# Altium footprint library xialeste-20221201.PcbLib: 195 footprints (part 7 of 13)
Each footprint in its own frame and in the unit in brackets; x right, y up, seen from the top. Pads: shape width x height; smd on the part's side, far side on the other; paste and mask are expansions set on the pad; w line width, h text height; cw(c..) or ccw(c..) is an arc to the next point about the centre after c.
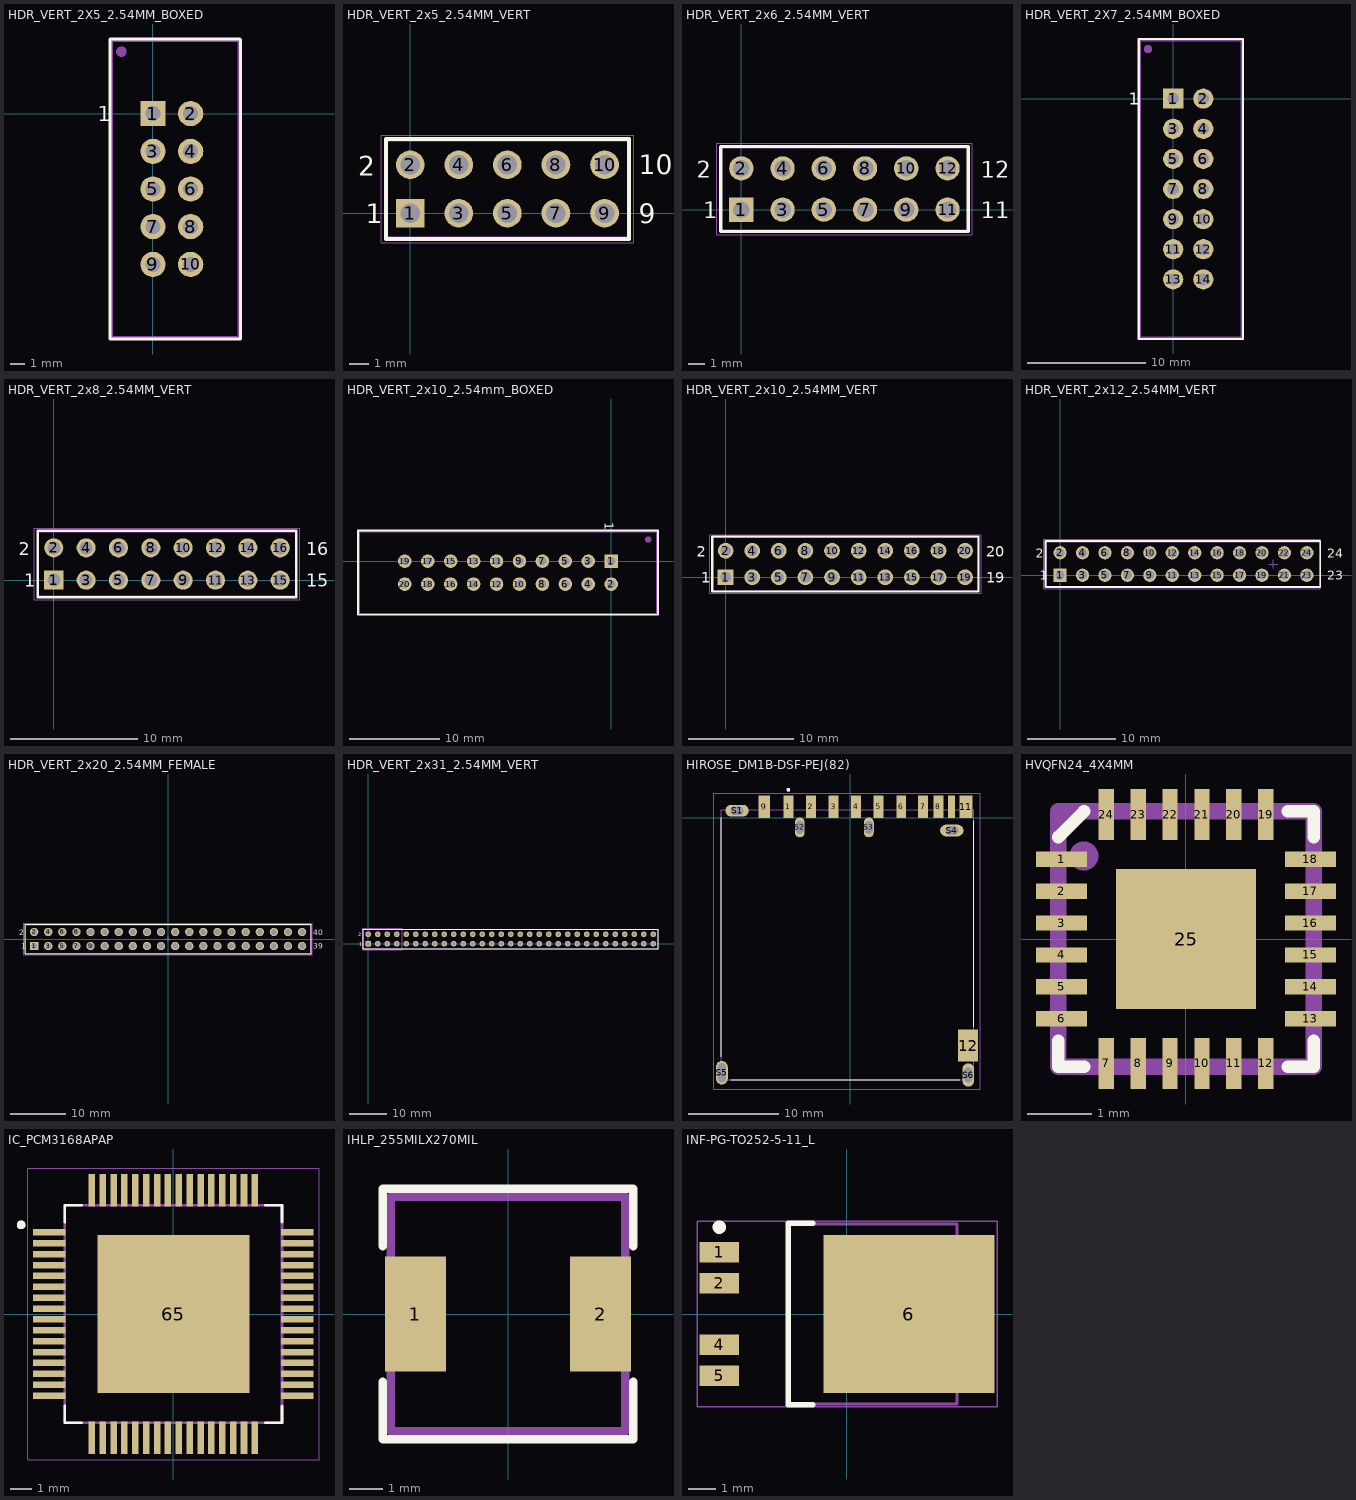
[diagram p6: the footprints below, top view; thin cyan lines are the x and y axes]

## HDR_VERT_2X5_2.54MM_BOXED [mm] "Creator MM"
height 9.91
pads (10):
  rect 1.7x1.7 hole 1: 1(0,0)
  round 1.7 hole 1: 2(2.54,0) 3(0,-2.54) 4(2.54,-2.54) 5(0,-5.08) 6(2.54,-5.08) 7(0,-7.62) 8(2.54,-7.62) 9(0,-10.16) 10(2.54,-10.16)
Top Overlay:
  lines w0.2: -2.9,-15.19 -2.9,5.03 5.86,5.03 5.89,5 5.89,-15.19 -2.9,-15.19
  text "1" at -3.73,-0.53 h1.02
Mechanical 29:
  circle w0.5: c-2.13,4.18 r0.1
  lines w0.2: -2.8,-15.09 -2.8,4.93 5.79,4.93 5.79,-15.09 -2.8,-15.09
  text ".Designator" at 0.5,-3.3 h1.52
3D body "DS1013-10S (IDC-10MS CONNFLY).stp": height 9, standoff -3.6, extent -3.251,-15.33 5.649,5.17

## HDR_VERT_2x5_2.54MM_VERT [mm] "Socket Header, Pitch 2.54 mm, THT, Vertical, dual row, 10p"
height 8.4
pads (10):
  rect 1.5x1.5 hole 1.02: 1(0,0)
  round 1.5 hole 1.02: 2(0,2.54) 3(2.54,0) 4(2.54,2.54) 5(5.08,0) 6(5.08,2.54) 7(7.62,0) 8(7.62,2.54) 9(10.16,0) 10(10.16,2.54)
Top Overlay:
  lines w0.2: -1.27,-1.345 -1.27,3.885 11.43,3.885 11.43,-1.345 -1.27,-1.345
  text "9" at 11.938,-0.508 h1.02
  text "10" at 11.938,2.032 h1.02
  text "2" at -2.73,1.97 h1.02
  text "1" at -2.33,-0.53 h1.02
Mechanical 13:
  lines w0.1: -1.27,-1.27 11.43,-1.27 11.43,3.81 -1.27,3.81 -1.27,-1.27
Mechanical 15:
  lines w0.05: -1.524,-1.545 11.684,-1.545 11.684,4.085 -1.524,4.085 -1.524,-1.545
3D body "Pin Header 2x5 TH Pitch 2.54mm.stp": height 2.8, standoff -9.9, extent -1.27,-1.27 11.43,3.81

## HDR_VERT_2x6_2.54MM_VERT [mm] "Socket Header, Pitch 2.54 mm, THT, Vertical, dual row, 12p"
height 8.4
pads (12):
  rect 1.5x1.5 hole 1.02: 1(0,0)
  round 1.5 hole 1.02: 2(0,2.54) 3(2.54,0) 4(2.54,2.54) 5(5.08,0) 6(5.08,2.54) 7(7.62,0) 8(7.62,2.54) 9(10.16,0) 10(10.16,2.54) 11(12.7,0) 12(12.7,2.54)
Top Overlay:
  lines w0.2: -1.27,-1.345 -1.27,3.885 13.97,3.885 13.97,-1.345 -1.27,-1.345
  text "11" at 14.73,-0.53 h1.02
  text "12" at 14.73,1.97 h1.02
  text "2" at -2.73,1.97 h1.02
  text "1" at -2.33,-0.53 h1.02
Mechanical 13:
  lines w0.1: -1.27,-1.27 13.97,-1.27 13.97,3.81 -1.27,3.81 -1.27,-1.27
Mechanical 15:
  lines w0.05: -1.524,-1.545 14.224,-1.545 14.224,4.085 -1.524,4.085 -1.524,-1.545
3D body "Pin Header 2x6 TH Pitch 2.54mm.stp": height 2.8, standoff -9.9, extent -1.27,-1.27 13.97,3.81

## HDR_VERT_2X7_2.54MM_BOXED [mm] "Creator MM"
height 9.91
pads (14):
  rect 1.7x1.7 hole 1: 1(0,0)
  round 1.7 hole 1: 2(2.54,0) 3(0,-2.54) 4(2.54,-2.54) 5(0,-5.08) 6(2.54,-5.08) 7(0,-7.62) 8(2.54,-7.62) 9(0,-10.16) 10(2.54,-10.16) 11(0,-12.7) 12(2.54,-12.7) 13(0,-15.24) 14(2.54,-15.24)
Top Overlay:
  lines w0.2: -2.9,-20.27 -2.9,5.03 5.89,5.03 5.89,-20.27 -2.9,-20.27
  text "1" at -3.73,-0.53 h1.02
Mechanical 29:
  circle w0.5: c-2.13,4.18 r0.1
  lines w0.2: -2.8,-20.17 -2.8,4.93 5.79,4.93 5.79,-20.17 -2.8,-20.17
  text ".Designator" at 2,-9.5 h1.52
3D body "DS1013-14S (IDC-14MS CONNFLY).stp": height 9, standoff -3.6, extent -3.23,-20.41 5.67,5.17

## HDR_VERT_2x8_2.54MM_VERT [mm] "Socket Header, Pitch 2.54 mm, THT, Vertical, dual row, 16p"
height 8.4
pads (16):
  rect 1.5x1.5 hole 1.02: 1(0,0)
  round 1.5 hole 1.02: 2(0,2.54) 3(2.54,0) 4(2.54,2.54) 5(5.08,0) 6(5.08,2.54) 7(7.62,0) 8(7.62,2.54) 9(10.16,0) 10(10.16,2.54) 11(12.7,0) 12(12.7,2.54) 13(15.24,0) 14(15.24,2.54) 15(17.78,0) 16(17.78,2.54)
Top Overlay:
  lines w0.2: -1.27,-1.345 19.05,-1.345 19.05,3.885 -1.27,3.885 -1.27,-1.345
  text "1" at -2.33,-0.53 h1.02
  text "2" at -2.73,1.97 h1.02
  text "16" at 19.81,1.97 h1.02
  text "15" at 19.81,-0.53 h1.02
Mechanical 13:
  lines w0.1: -1.27,-1.27 -1.27,3.81 19.05,3.81 19.05,-1.27 -1.27,-1.27
Mechanical 15:
  lines w0.05: -1.524,-1.545 -1.524,4.085 19.304,4.085 19.304,-1.545 -1.524,-1.545
3D body "Pin Header 2x8 TH Pitch 2.54mm.stp": height 2.8, standoff -9.9, extent -1.27,-1.27 19.05,3.81

## HDR_VERT_2x10_2.54mm_BOXED [mm] "Creator MM"
height 9.7
pads (20):
  rect 1.5x1.5 hole 0.9: 1(0,0)
  round 1.5 hole 0.9: 2(0,-2.54) 3(-2.54,0) 4(-2.54,-2.54) 5(-5.08,0) 6(-5.08,-2.54) 7(-7.62,0) 8(-7.62,-2.54) 9(-10.16,0) 10(-10.16,-2.54) 11(-12.7,0) 12(-12.7,-2.54) 13(-15.24,0) 14(-15.24,-2.54) 15(-17.78,0) 16(-17.78,-2.54) 17(-20.32,0) 18(-20.32,-2.54) 19(-22.86,0) 20(-22.86,-2.54)
Top Overlay:
  lines w0.2: -28.04,-5.942 -28.04,3.402 5.178,3.402 5.18,3.4 5.18,-5.942 -28.04,-5.942
  text "1" at -0.7,4.3 h1.02
Mechanical 29:
  circle w0.5: c4.1,2.4 r0.1
  lines w0.2: -27.94,-5.842 -27.94,3.302 5.08,3.302 5.08,-5.842 -27.94,-5.842
  text ".Designator" at -13.5,-2 h1.52
3D body "DS1013-20S (IDC-20MS CONNFLY).stp": height 9, standoff -3.6, extent -28.03,-5.77 5.17,3.13

## HDR_VERT_2x10_2.54MM_VERT [mm] "Socket Header, Pitch 2.54 mm, THT, Vertical, dual row, 10p"
height 8.4
pads (20):
  rect 1.5x1.5 hole 1.02: 1(0,0)
  round 1.5 hole 1.02: 2(0,2.54) 3(2.54,0) 4(2.54,2.54) 5(5.08,0) 6(5.08,2.54) 7(7.62,0) 8(7.62,2.54) 9(10.16,0) 10(10.16,2.54) 11(12.7,0) 12(12.7,2.54) 13(15.24,0) 14(15.24,2.54) 15(17.78,0) 16(17.78,2.54) 17(20.32,0) 18(20.32,2.54) 19(22.86,0) 20(22.86,2.54)
Top Overlay:
  lines w0.2: -1.27,-1.345 -1.27,3.885 24.13,3.885 24.13,-1.345 -1.27,-1.345
  text "19" at 24.89,-0.53 h1.02
  text "20" at 24.89,1.97 h1.02
  text "2" at -2.73,1.97 h1.02
  text "1" at -2.33,-0.53 h1.02
Mechanical 13:
  lines w0.1: -1.27,-1.27 24.13,-1.27 24.13,3.81 -1.27,3.81 -1.27,-1.27
Mechanical 15:
  lines w0.05: -1.524,-1.545 24.384,-1.545 24.384,4.085 -1.524,4.085 -1.524,-1.545
3D body "Pin Header 2x10 TH Pitch 2.54mm.stp": height 2.8, standoff -9.9, extent -1.27,-1.27 24.13,3.81

## HDR_VERT_2x12_2.54MM_VERT [mm] "Socket Header, Pitch 2.54 mm, THT, Vertical, dual row, 24p"
height 8.4
pads (24):
  rect 1.5x1.5 hole 1.02: 1(0,0)
  round 1.5 hole 1.02: 2(0,2.54) 3(2.54,0) 4(2.54,2.54) 5(5.08,0) 6(5.08,2.54) 7(7.62,0) 8(7.62,2.54) 9(10.16,0) 10(10.16,2.54) 11(12.7,0) 12(12.7,2.54) 13(15.24,0) 14(15.24,2.54) 15(17.78,0) 16(17.78,2.54) 17(20.32,0) 18(20.32,2.54) 19(22.86,0) 20(22.86,2.54) 21(25.4,0) 22(25.4,2.54) 23(27.94,0) 24(27.94,2.54)
Top Overlay:
  lines w0.2: -1.645,-1.345 -1.645,3.885 29.464,3.885 29.464,-1.345 -1.645,-1.345
  text "23" at 30.224,-0.53 h1.02
  text "24" at 30.224,1.97 h1.02
  text "2" at -2.73,1.97 h1.02
  text "1" at -2.33,-0.53 h1.02
Mechanical 13:
  lines w0.1: -1.52,-1.27 29.464,-1.27 29.464,3.81 -1.52,3.81 -1.52,-1.27
Mechanical 15:
  lines w0.05: 23.63,1.27 24.63,1.27 ; 24.13,0.77 24.13,1.77 ; -1.845,-1.545 29.464,-1.545 29.464,4.085 -1.845,4.085 -1.845,-1.545
3D body "24-Pin Header - Female - Double - 2.54mm.step": height 2.6, standoff -8.9, extent -1.52,-1.25 29.46,3.75

## HDR_VERT_2x20_2.54MM_FEMALE [mm] "Socket Header, Pitch 2.54 mm, THT, Vertical, dual row, 40p"
height 8.4
pads (40):
  rect 1.5x1.5 hole 1.02: 1(-24.13,-1.27)
  round 1.5 hole 1.02: 2(-24.13,1.27) 3(-21.59,-1.27) 4(-21.59,1.27) 5(-19.05,-1.27) 6(-19.05,1.27) 7(-16.51,-1.27) 8(-16.51,1.27) 9(-13.97,-1.27) 10(-13.97,1.27) 11(-11.43,-1.27) 12(-11.43,1.27) 13(-8.89,-1.27) 14(-8.89,1.27) 15(-6.35,-1.27) 16(-6.35,1.27) 17(-3.81,-1.27) 18(-3.81,1.27) 19(-1.27,-1.27) 20(-1.27,1.27) 21(1.27,-1.27) 22(1.27,1.27) 23(3.81,-1.27) 24(3.81,1.27) 25(6.35,-1.27) 26(6.35,1.27) 27(8.89,-1.27) 28(8.89,1.27) 29(11.43,-1.27) 30(11.43,1.27) 31(13.97,-1.27) 32(13.97,1.27) 33(16.51,-1.27) 34(16.51,1.27) 35(19.05,-1.27) 36(19.05,1.27) 37(21.59,-1.27) 38(21.59,1.27) 39(24.13,-1.27) 40(24.13,1.27)
Top Overlay:
  lines w0.2: -25.775,-2.615 -25.775,2.615 25.775,2.615 25.775,-2.615 -25.775,-2.615
  text "39" at 26.16,-1.8 h1.02
  text "40" at 26.16,0.7 h1.02
  text "2" at -26.86,0.7 h1.02
  text "1" at -26.46,-1.8 h1.02
Mechanical 13:
  lines w0.1: -25.65,-2.54 25.65,-2.54 25.65,2.54 -25.65,2.54 -25.65,-2.54
Mechanical 15:
  lines w0.05: -0.5,0 0.5,0 ; 0,-0.5 0,0.5 ; -25.975,-2.815 25.975,-2.815 25.975,2.815 -25.975,2.815 -25.975,-2.815
3D body "40-Pin Header - Female - Double - 2.54mm.step": height 8.5, standoff -3, extent -25.625,-2.485 25.675,2.515

## HDR_VERT_2x31_2.54MM_VERT [mm] "Socket Header, Pitch 2.54 mm, THT, Vertical, dual row, 62p"
height 8.4
pads (62):
  rect 1.5x1.5 hole 1.02: 1(0,0)
  round 1.5 hole 1.02: 2(0,2.54) 3(2.54,0) 4(2.54,2.54) 5(5.08,0) 6(5.08,2.54) 7(7.62,0) 8(7.62,2.54) 9(10.16,0) 10(10.16,2.54) 11(12.7,0) 12(12.7,2.54) 13(15.24,0) 14(15.24,2.54) 15(17.78,0) 16(17.78,2.54) 17(20.32,0) 18(20.32,2.54) 19(22.86,0) 20(22.86,2.54) 21(25.4,0) 22(25.4,2.54) 23(27.94,0) 24(27.94,2.54) 25(30.48,0) 26(30.48,2.54) 27(33.02,0) 28(33.02,2.54) 29(35.56,0) 30(35.56,2.54) 31(38.1,0) 32(38.1,2.54) 33(40.64,0) 34(40.64,2.54) 35(43.18,0) 36(43.18,2.54) 37(45.72,0) 38(45.72,2.54) 39(48.26,0) 40(48.26,2.54) 41(50.8,0) 42(50.8,2.54) 43(53.34,0) 44(53.34,2.54) 45(55.88,0) 46(55.88,2.54) 47(58.42,0) 48(58.42,2.54) 49(60.96,0) 50(60.96,2.54) 51(63.5,0) 52(63.5,2.54) 53(66.04,0) 54(66.04,2.54) 55(68.58,0) 56(68.58,2.54) 57(71.12,0) 58(71.12,2.54) 59(73.66,0) 60(73.66,2.54) 61(76.2,0) 62(76.2,2.54)
Top Overlay:
  lines w0.2: -1.27,-1.345 -1.27,3.885 77.47,3.885 77.47,-1.345 -1.27,-1.345
  text "1" at -2.33,-0.53 h1.02
  text "2" at -2.73,1.97 h1.02
  text "8" at 9.65,1.97 h1.02
  text "7" at 9.65,-0.53 h1.02
Mechanical 13:
  lines w0.1: -1.27,-1.27 -1.27,3.81 77.47,3.81 77.47,-1.27 -1.27,-1.27
Mechanical 15:
  lines w0.05: -1.524,-1.545 -1.524,4.085 9.144,4.085 9.144,-1.545 -1.524,-1.545

## HIROSE_DM1B-DSF-PEJ(82) [mm]
pads (18):
  rect 1.1x2.5 smd: 1(-6.875,1.25) 2(-4.375,1.25) 3(-1.875,1.25) 4(0.625,1.25) 5(3.125,1.25) 6(5.625,1.25) 7(8.05,1.25) 8(9.75,1.25)
  rect 1.25x2.5 smd: 9(-9.57,1.25)
  rect 0.8x2.5 smd: 10(11.2,1.25)
  rect 1.4x2.5 smd: 11(12.8,1.25)
  rect 2.2x3.5 smd: 12(13.03,-25.23)
  oval 2.6x1.3 hole 0.9 slot 1.4 at 0 deg: S1(-12.57,0.8) S4(11.23,-1.4)
  oval 1.1x2.2 hole 0.9 slot 1.4 at 90 deg: S2(-5.62,-1.05) S3(2.03,-1.05)
  oval 1.3x2.6 hole 0.9 slot 2.1 at 90 deg: S5(-14.25,-28.25)
  oval 1.3x2.6 hole 0.9 slot 1.6 at 90 deg: S6(13.06,-28.5)
Top Overlay:
  circle w0.2: c-6.875,3.1 r0.1
  lines w0.127: -14.35,-26.5 -14.35,0 ; -13.28,-29 12.09,-29 ; 13.65,-23.16 13.65,-0.32
Mechanical 13:
  circle w0.2: c-6.875,3.1 r0.1
  lines w0.127: -14.35,-29 13.65,-29 13.65,0.9 -14.35,0.9 -14.35,-29
Mechanical 15:
  lines w0.05: -15.15,-30.05 -15.15,2.75 14.38,2.75 14.38,-30.05 -15.15,-30.05
3D body "DM1B-DSF-PEJ.stp": height 2.9, standoff -0.65, extent -14.377,-29.622 13.673,0.828

## HVQFN24_4X4MM [mm]
pads (25):
  rect 0.8x0.24 smd mask+0.025: 1(-1.95,1.25) 2(-1.95,0.75) 3(-1.95,0.25) 4(-1.95,-0.25) 5(-1.95,-0.75) 6(-1.95,-1.25) 13(1.95,-1.25) 14(1.95,-0.75) 15(1.95,-0.25) 16(1.95,0.25) 17(1.95,0.75) 18(1.95,1.25)
  rect 0.24x0.8 smd mask+0.025: 7(-1.25,-1.95) 8(-0.75,-1.95) 9(-0.25,-1.95) 10(0.25,-1.95) 11(0.75,-1.95) 12(1.25,-1.95) 19(1.25,1.95) 20(0.75,1.95) 21(0.25,1.95) 22(-0.25,1.95) 23(-0.75,1.95) 24(-1.25,1.95)
  rect 2.2x2.2 smd mask+0.025: 25(0,0)
Top Overlay:
  lines w0.2: -2,-1.6 -2,-2 -1.6,-2 ; -2,1.6 -1.6,2 ; 1.6,-2 2,-2 2,-1.6 ; 1.6,2 2,2 2,1.6
Mechanical 29:
  circle w0.254: c-1.6,1.3 r0.1
  lines w0.254: -2,-2 2,-2 2,2 -2,2 -2,-2
  text ".Designator" at -0.2,0.7 h0.6
3D body: height 1, standoff 0, extent -2,-2 2,2

## IC_PCM3168APAP [mm]
pads (65):
  rect 1.5x0.3 smd mask+0.05: 1(-5.7,3.75) 2(-5.7,3.25) 3(-5.7,2.75) 4(-5.7,2.25) 5(-5.7,1.75) 6(-5.7,1.25) 7(-5.7,0.75) 8(-5.7,0.25) 9(-5.7,-0.25) 10(-5.7,-0.75) 11(-5.7,-1.25) 12(-5.7,-1.75) 13(-5.7,-2.25) 14(-5.7,-2.75) 15(-5.7,-3.25) 16(-5.7,-3.75) 33(5.7,-3.75) 34(5.7,-3.25) 35(5.7,-2.75) 36(5.7,-2.25) 37(5.7,-1.75) 38(5.7,-1.25) 39(5.7,-0.75) 40(5.7,-0.25) 41(5.7,0.25) 42(5.7,0.75) 43(5.7,1.25) 44(5.7,1.75) 45(5.7,2.25) 46(5.7,2.75) 47(5.7,3.25) 48(5.7,3.75)
  rect 0.3x1.5 smd mask+0.05: 17(-3.75,-5.7) 18(-3.25,-5.7) 19(-2.75,-5.7) 20(-2.25,-5.7) 21(-1.75,-5.7) 22(-1.25,-5.7) 23(-0.75,-5.7) 24(-0.25,-5.7) 25(0.25,-5.7) 26(0.75,-5.7) 27(1.25,-5.7) 28(1.75,-5.7) 29(2.25,-5.7) 30(2.75,-5.7) 31(3.25,-5.7) 32(3.75,-5.7) 49(3.75,5.7) 50(3.25,5.7) 51(2.75,5.7) 52(2.25,5.7) 53(1.75,5.7) 54(1.25,5.7) 55(0.75,5.7) 56(0.25,5.7) 57(-0.25,5.7) 58(-0.75,5.7) 59(-1.25,5.7) 60(-1.75,5.7) 61(-2.25,5.7) 62(-2.75,5.7) 63(-3.25,5.7) 64(-3.75,5.7)
  rect 7x7.26 smd mask+0: 65(0,0)
Top Overlay:
  circle w0.2: c-7,4.1 r0.1
  lines w0.127: -5,-4.23 -5,-5 -4.23,-5 ; -5,4.23 -5,5 -4.23,5 ; 4.23,-5 5,-5 5,-4.23 ; 4.23,5 5,5 5,4.23
Mechanical 13:
  circle w0.2: c-7,4.1 r0.1
  lines w0.127: -5,-5 5,-5 5,5 -5,5 -5,-5
Mechanical 15:
  lines w0.05: -6.7,-6.7 6.7,-6.7 6.7,6.7 -6.7,6.7 -6.7,-6.7
3D body "step_temp.STEP": height 1.2, standoff 0, extent -6,-6 6,6

## IHLP_255MILX270MIL [mil]
pads (2):
  rect 72x135 smd: 1(-109,0) 2(109,0)
Top Overlay:
  lines w10: -147.64,-80 -147.64,-147.64 147.64,-147.64 147.64,-80 ; -147.64,80 -147.64,147.64 147.64,147.64 147.64,80
Mechanical 29:
  lines w10: -137.8,-137.8 137.8,-137.8 137.8,137.8 -137.8,137.8 -137.8,-137.8
  text ".Designator" at 39.37,27.56 h60
3D body: height 118.11, standoff 0, extent -95.72,-130 95.77,130.01
3D body: height 118.11, standoff 0, extent -119.25,-130 -72.19,-82.85
3D body: height 118.11, standoff 0, extent -119.25,82.94 -72.1,130
3D body: height 118.11, standoff 0, extent 72.19,82.95 119.34,130.01
3D body: height 118.11, standoff 0, extent 72.2,-130 119.25,-82.85
3D body: height 118.11, standoff 0, extent 95.63,-106.43 119.34,106.57
3D body: height 118.11, standoff 0, extent -119.25,-106.42 -95.53,106.57
3D body: height 78.74, standoff 0, extent -134.93,-62.92 -119.18,63.07
3D body: height 78.74, standoff 0, extent 119.34,-62.92 135.09,63.06

## IMX6 REX MODULE 3D [mm] ".Creator MM"
3D body "iMX6 Rex_V1I1_PCB(Prototype) - 18-OCT-2013.step": height 9.6, standoff 1.61, extent 0,0 70,40

## INF-PG-TO252-5-11_L [mm] "DPAK, 5-Leads, Body 6.5x6.12mm, Pitch 1.14mm, IPC High Density"
height 2.35
pads (5):
  rect 1.45x0.75 smd: 1(-4.7,2.28) 2(-4.7,1.14) 4(-4.7,-1.14) 5(-4.7,-2.28)
  rect 6.3x5.85 smd: 6(2.3,0)
Top Overlay:
  circle w0.25: c-4.7,3.205 r0.125
  lines w0.2: -1.25,-3.35 -2.15,-3.35 -2.15,3.35 -1.25,3.35
Mechanical 13:
  lines w0.1: -2.15,-3.325 -2.15,3.325 4.07,3.325 4.07,-3.325 -2.15,-3.325
Mechanical 15:
  lines w0.05: -5.525,-3.425 -5.525,3.425 5.55,3.425 5.55,-3.425 -5.525,-3.425
  lines w0.1: -0.5,0 0.5,0 ; 0,-0.5 0,0.5
3D body: height 2.35, standoff 0, extent -2.15,-3.325 4.07,3.325